# Altium footprint library base-32-bit.PcbLib: 35 footprints (part 2 of 3)
Each footprint in its own frame and in the unit in brackets; x right, y up, seen from the top. Pads: shape width x height; smd on the part's side, far side on the other; paste and mask are expansions set on the pad; w line width, h text height; cw(c..) or ccw(c..) is an arc to the next point about the centre after c.
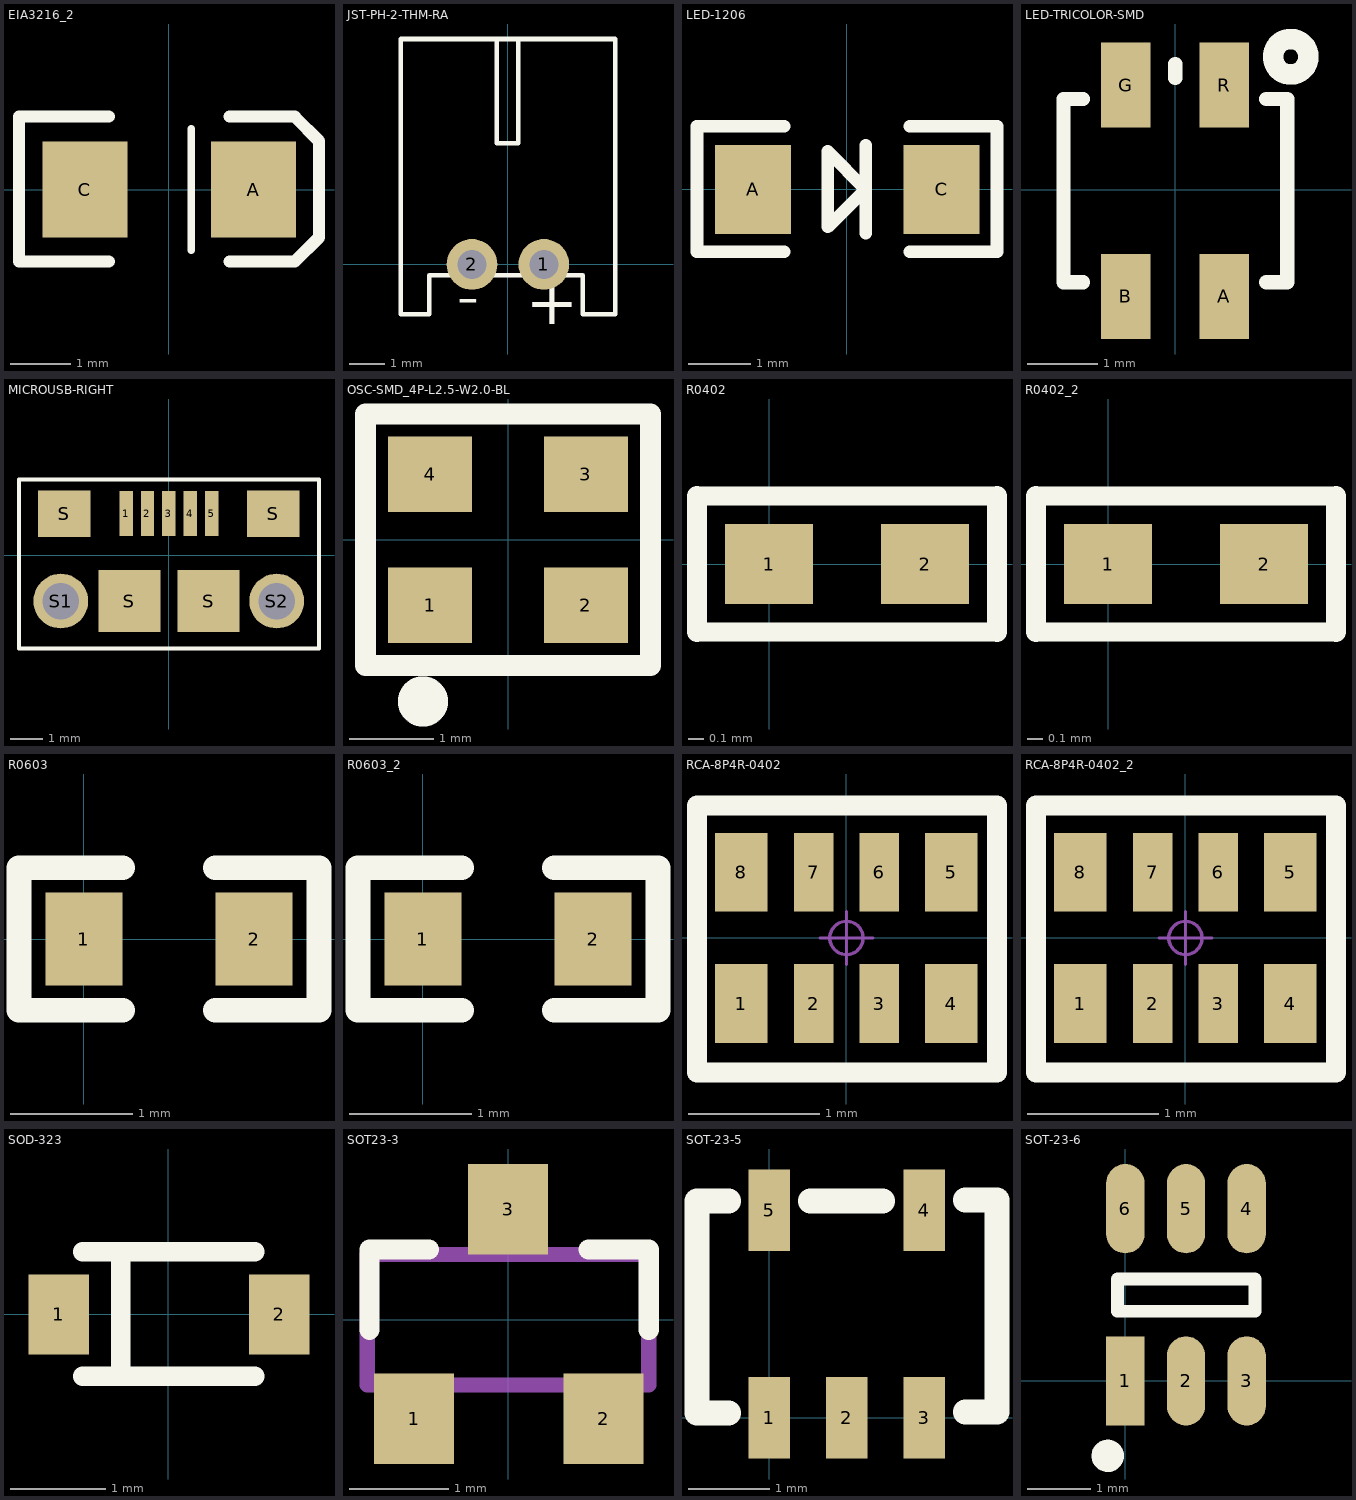
[diagram p1: the footprints below, top view; thin cyan lines are the x and y axes]

## EIA3216_2 [mil]
pads (2):
  rect 56x63 smd: A(56,0) C(-55.12,0)
Top Overlay:
  lines w5: 15,-40 15,40
  lines w8: -39.37,-47.24 -98.43,-47.24 -98.43,48 -39.37,48 ; 40,-47.24 83,-47.24 99,-31.5 99,32 83,48 40,48
3D body "User Library-CAP_TAN_C3216_1206.step": height 70.87, standoff 0, extent -67.93,-35.43 65.93,35.44

## JST-PH-2-THM-RA [mil] "JST-PH-2-THM-RA"
pads (2):
  round 56 hole 32: 1(40,0) 2(-39.37,0)
Top Overlay:
  lines w5: -11.81,249 -11.81,134 12,134 12,249 ; -118.11,-55.12 -118.11,249 119,249 119,-55.12 87,-55.12 83,-55.12 83,-11.81 -86.61,-11.81 -86.61,-55.12 -118.11,-55.12
  text "+" at 20,-82.52 h86.8
  text "-" at -56.26,-74.65 h86.8
3D body "User Library-S2B.step": height 192.76, standoff -130.08, extent -116.29,-46.11 116,253.1

## LED-1206 [mil] "LED-1206"
pads (2):
  rect 48x56 smd: A(-59.06,0) C(60,0)
Top Overlay:
  lines w8: -39.37,-39.37 -94.49,-39.37 -94.49,40 -39.37,40 ; 12,-27.56 12,0 ; 12,28 12,0 ; 40,-39.37 95,-39.37 95,40 40,40 ; 12,0 -11.81,24 -11.81,-23.62 12,0
3D body "LED 1206-B.STEP": height 35.58, standoff -0.16, extent -62,-31.5 64.06,31.57
3D body "LED 1206玻璃罩.STEP": height 39.57, standoff 19.88, extent -43,-31.57 45.65,31.5

## LED-TRICOLOR-SMD [mil] "LED-TRICOLOR-SMD"
pads (4):
  rect 28x48 smd: A(27.56,-60) B(-28,-60) G(-28,59.06) R(27.56,59.06)
Top Overlay:
  circle w11.55: c65,75 r10
  lines w8: -52,-52 -63,-52 -63,51.18 -52,51.18 ; 0,62.99 0,70.87 ; 51.18,-52 62.99,-52 62.99,51.18 51.18,51.18
3D body "User Library-KAA-3528.step": height 74.8, standoff 0, extent -55.12,-70.39 55.12,67.4

## MICROUSB-RIGHT [mil] "MICROUSB-RIGHT"
pads (11):
  rect 16x54 smd: 1(-51.18,50) 2(-25.59,50) 3(0,50) 4(26,50) 5(52,50)
  rect 63x56 smd: S(-125.98,50) S(126,50)
  rect 75x75 smd: S(-47.24,-55.31) S(48,-55.31)
  round 66 hole 44: S1(-129.92,-55.31) S2(130,-55.31)
Top Overlay:
  lines w5: -180.31,-112.4 -180.31,91 181,91 181,-112.4 -180.31,-112.4
3D body "User Library-10104110.step": height 107.33, standoff -11.91, extent -159.02,-156.89 159.04,62.16

## OSC-SMD_4P-L2.5-W2.0-BL [mm]
pads (4):
  rect 1x0.9 smd: 1(-0.93,-0.78) 2(0.93,-0.78) 3(0.93,0.78) 4(-0.93,0.78)
Top Overlay:
  lines w0.254: -1.7,-1.5 1.7,-1.5 1.7,1.5 -1.7,1.5 -1.7,-1.5
  lines w0.3: -1.016,-1.778 ccw(c-1.015,-1.928) -1.013,-1.778
3D body "OSC 2025-4.STEP": height 0.55, standoff -0.02, extent -1.225,-1.025 1.275,0.975

## R0402 [mil]
pads (2):
  rect 22x20 smd: 1(0,0) 2(39,0)
Top Overlay:
  lines w4.72: -18,-17 57,-17 ; -18,17 57,17
  lines w5: -18,-17 -18,17 ; 57,-17 57,17
3D body "R 0402.STEP": height 11.85, standoff -0.09, extent 0.32,-9.84 39.69,9.85

## R0402_2 [mil]
pads (2):
  rect 22x20 smd: 1(0,0) 2(39,0)
Top Overlay:
  lines w4.72: -18,-17 57,-17 ; -18,17 57,17
  lines w5: -18,-17 -18,17 ; 57,-17 57,17
3D body "R 0402.STEP": height 11.85, standoff -0.09, extent 0.32,-9.84 39.69,9.85

## R0603 [mil]
pads (2):
  rect 25x30 smd: 1(0,0) 2(55,0)
Top Overlay:
  lines w8: 12.5,-23 -21,-23 -21,23 12.5,23 ; 42.5,-23 76,-23 76,23 42.5,23
3D body "R 0603.STEP": height 15.79, standoff -0.13, extent -3.49,-15.74 59.5,15.75

## R0603_2 [mil]
pads (2):
  rect 25x30 smd: 1(0,0) 2(55,0)
Top Overlay:
  lines w8: 12.5,-23 -21,-23 -21,23 12.5,23 ; 42.5,-23 76,-23 76,23 42.5,23
3D body "R 0603.STEP": height 15.79, standoff -0.13, extent -4.49,-15.74 58.5,15.75

## RCA-8P4R-0402 [mm] "2mm*1mm*0.45mm(长*宽*厚)"
pads (8):
  rect 0.4x0.6 smd: 1(-0.8,-0.5) 4(0.8,-0.5) 5(0.8,0.5) 8(-0.8,0.5)
  rect 0.3x0.6 smd: 2(-0.25,-0.5) 3(0.25,-0.5) 6(0.25,0.5) 7(-0.25,0.5)
Top Overlay:
  lines w0.152: -1.139,-1.024 1.147,-1.024 1.147,1.008 -1.139,1.008 -1.139,-1.024
Mechanical 15:
  circle w0.025: c0,0 r0.127
  lines w0.025: -0.2,0 0.2,0 ; 0,-0.2 0,0.2
3D body "RCA-8P4R-0402.STEP": height 0.45, standoff 0, extent -1,-0.5 1,0.5

## RCA-8P4R-0402_2 [mm]
pads (8):
  rect 0.4x0.6 smd: 1(-0.8,-0.5) 4(0.8,-0.5) 5(0.8,0.5) 8(-0.8,0.5)
  rect 0.3x0.6 smd: 2(-0.25,-0.5) 3(0.25,-0.5) 6(0.25,0.5) 7(-0.25,0.5)
Top Overlay:
  lines w0.152: -1.139,-1.024 -1.139,1.008 1.147,1.008 1.147,-1.024 -1.139,-1.024
Mechanical 15:
  circle w0.025: c0,0 r0.127
  lines w0.025: -0.2,0 0.2,0 ; 0,-0.2 0,0.2
3D body "RCA-8P4R-0402.STEP": height 0.45, standoff 0, extent -1,-0.5 1,0.5

## SOD-323 [mil] "SOD-323"
pads (2):
  rect 25x33 smd: 1(-45.28,0) 2(46,0)
Top Overlay:
  lines w8: -35.43,-25.59 -19.68,-25.59 ; -35.43,26 -19.68,26 ; 36,-25.59 -19.68,-25.59 ; 36,26 -19.68,26 ; -19.68,-25.59 -19.68,26
3D body "User Library-SOD-323F.STEP": height 31.13, standoff -3.3, extent -53.15,-26 53.15,27.15

## SOT23-3 [mil] "SOT23-3"
pads (3):
  rect 32x36 smd: 1(-37.4,-39.37) 2(38,-39.37) 3(0,44)
Top Overlay:
  lines w8: -55.12,-3.94 -55.12,28 -31.5,28 ; 32,28 56,28 56,-3.94
Mechanical 16:
  lines w6: -56,-26 56,-26 56,26 -56,26 -56,-26
3D body "User Library-3-lead sot23-3.STEP": height 39.59, standoff -0.57, extent -56.98,-47.71 57.99,49.78

## SOT-23-5 [mm]
pads (5):
  rect 0.508x1 smd: 1(0,0) 2(0.95,0) 3(1.9,0) 4(1.9,2.54) 5(0,2.54)
Top Overlay:
  lines w0.305: -0.497,0.056 -0.886,0.056 -0.886,2.656 -0.497,2.656 ; 0.503,2.656 1.391,2.656 ; 2.403,0.067 2.791,0.067 2.791,2.667 2.403,2.667
3D body "SOT23-5-2.STEP": height 1.45, standoff 0, extent -0.497,-0.117 2.403,2.683

## SOT-23-6 [mm]
pads (6):
  rect 0.6x1.4 smd: 1(0,0)
  oval 0.6x1.4 smd: 2(0.95,0) 3(1.9,0) 4(1.9,2.7) 5(0.95,2.7) 6(0,2.7)
Top Overlay:
  circle w0.254: c-0.277,-1.175 r0.127
  lines w0.203: -0.127,1.092 -0.127,1.6 2.032,1.6 2.032,1.092 -0.127,1.092
3D body "User Library-SOT-23-6.STEP": height 1.07, standoff -0.03, extent -0.457,0.14 2.337,2.565